# Altium footprint library PcbLib1.PcbLib: 136 footprints (part 4 of 9)
Each footprint in its own frame and in the unit in brackets; x right, y up, seen from the top. Pads: shape width x height; smd on the part's side, far side on the other; paste and mask are expansions set on the pad; w line width, h text height; cw(c..) or ccw(c..) is an arc to the next point about the centre after c.
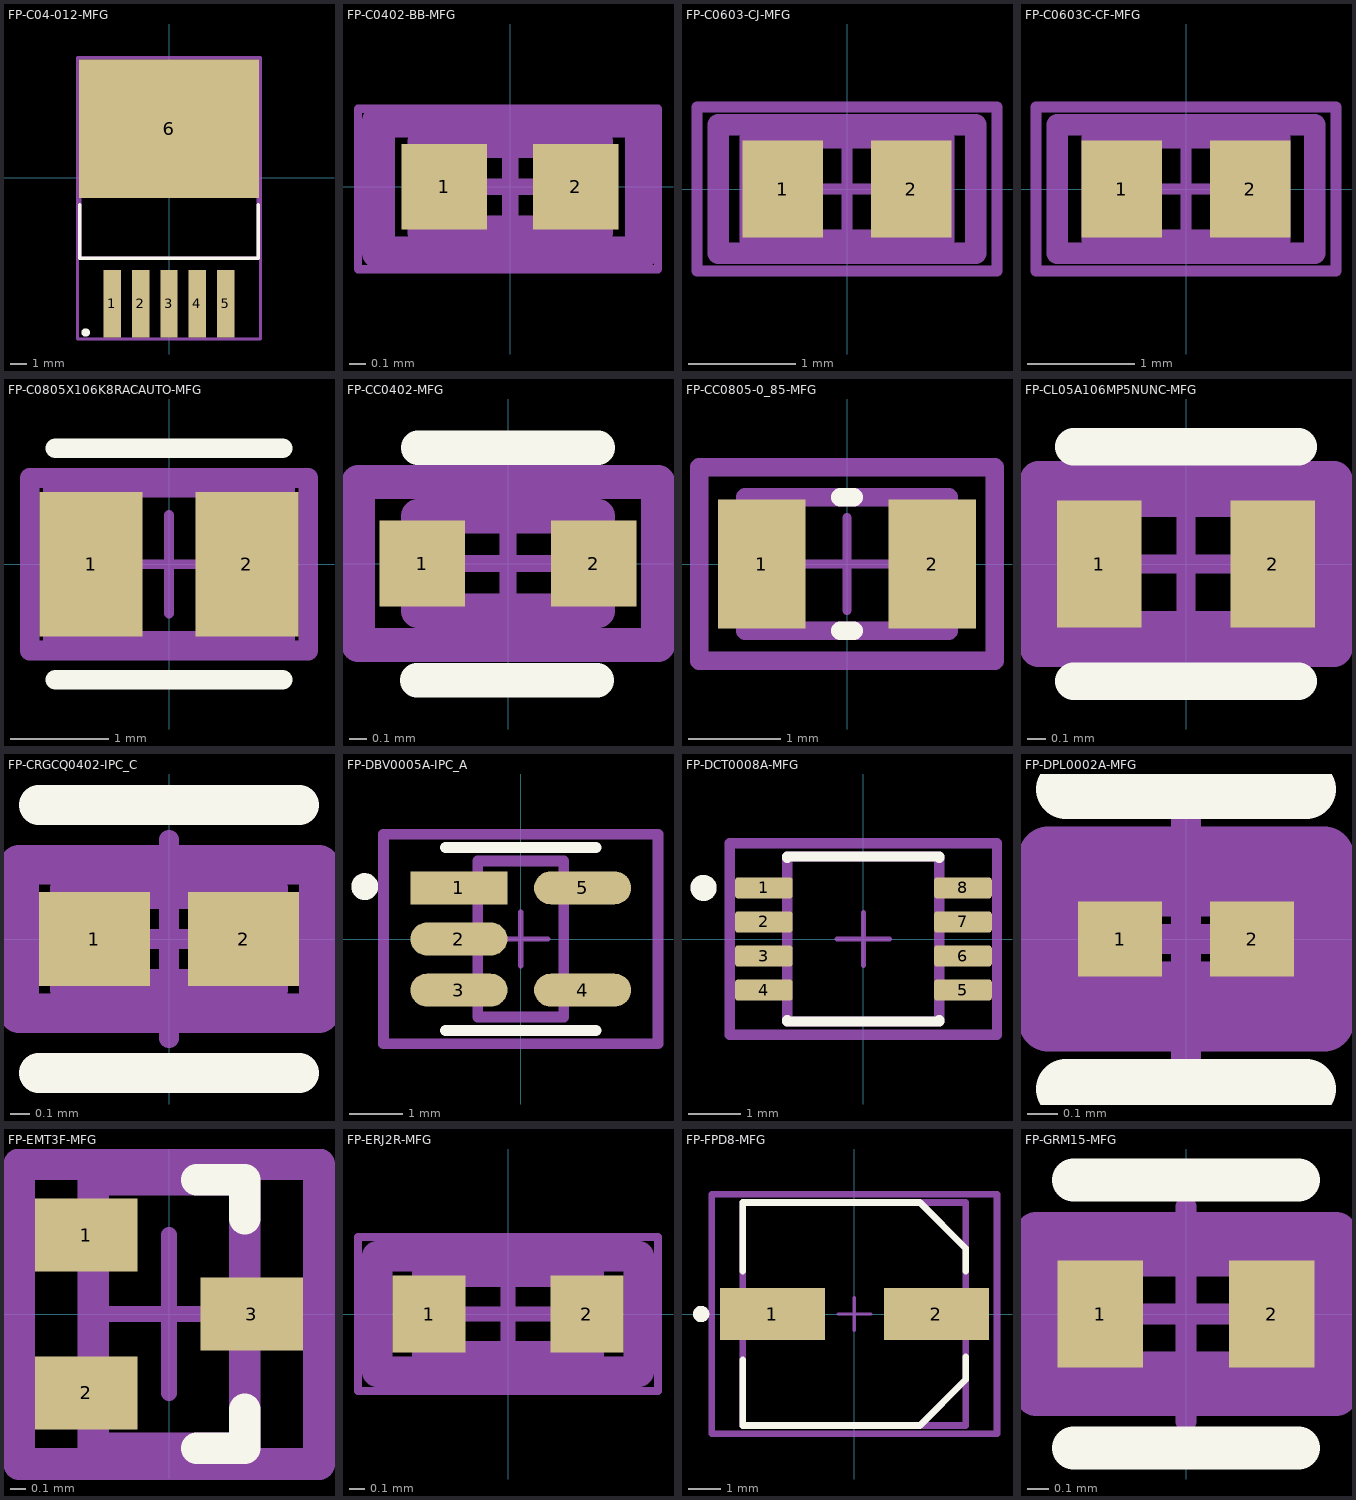
[diagram p3: the footprints below, top view; thin cyan lines are the x and y axes]

## FP-C04-012-MFG [mil]
pads (6):
  rect 41x159 smd paste+0 mask+0: 1(-134,-296.75) 2(-67,-296.75) 3(0,-296.75) 4(67,-296.75) 5(134,-296.75)
  rect 423x327 smd paste+0 mask+0: 6(0,114.75)
Top Overlay:
  circle w9.84: c-196.22,-364.89 r4.92
  lines w7.87: -210,-63.51 -210,-190 210,-190 210,-63.51
Top Courtyard:
  lines w7.87: -215.44,-380.19 -215.44,282.19 215.44,282.19 215.44,-380.19 -215.44,-380.19
Top 3D Body:
  lines w7.87: -210,-190 -210,190 210,190 210,-190 -210,-190
Top Assembly:
  lines w7.87: -215.44,-380.19 -215.44,282.19 215.44,282.19 215.44,-380.19 -215.44,-380.19
  text ".Designator" at 0,-49.02 h39.37
Top Component Center:
  lines w3.94: -19.68,0 19.68,0 ; 0,-19.68 0,19.68
3D body "IC_Microchip_MIC29302WU-TR_eec.STEP": height 200.04, standoff 0, extent -200,-344 200,244.5

## FP-C0402-BB-MFG [mm]
pads (2):
  rect 0.52x0.52 smd paste+0 mask+0: 1(-0.4,0) 2(0.4,0)
Top Courtyard:
  lines w0.2: -0.8,-0.4 -0.8,0.4 0.8,0.4 0.8,-0.4 -0.8,-0.4
Top 3D Body:
  lines w0.2: -0.525,-0.275 -0.525,0.275 0.525,0.275 0.525,-0.275 -0.525,-0.275
Top Assembly:
  lines w0.2: -0.8,-0.4 -0.8,0.4 0.8,0.4 0.8,-0.4 -0.8,-0.4
  text ".Designator" at -0.525,0.173 h0.25
Mechanical 15:
  lines w0.05: -0.925,-0.5 -0.925,0.475 -0.475,0.475 0.9,0.475 0.9,-0.5 -0.925,-0.5
Top Component Center:
  lines w0.1: -0.5,0 0.5,0 ; 0,-0.425 0,0.425
3D body "Cap_Kemet_C0402C562J5RACTU_eec.STEP": height 0.25, standoff 0, extent -0.8,-0.4 0.8,0.4

## FP-C0603-CJ-MFG [mm]
pads (2):
  rect 0.75x0.9 smd paste+0 mask+0: 1(-0.6,0) 2(0.6,0)
Top Courtyard:
  lines w0.2: -1.2,-0.6 -1.2,0.6 1.2,0.6 1.2,-0.6 -1.2,-0.6
Top 3D Body:
  lines w0.2: -0.9,-0.475 -0.9,0.475 0.9,0.475 0.9,-0.475 -0.9,-0.475
Top Assembly:
  lines w0.2: -1.2,-0.6 -1.2,0.6 1.2,0.6 1.2,-0.6 -1.2,-0.6
  text ".Designator" at 0,0.024 h0.13
Mechanical 15:
  lines w0.101: -1.397,-0.762 1.397,-0.762 1.397,0.762 -1.397,0.762 -1.397,-0.762
Top Component Center:
  lines w0.1: -0.5,0 0.5,0 ; 0,-0.5 0,0.5
3D body "Cap_KEMET_C0603C105K8RACAUTO_eec.STEP": height 0.95, standoff 0, extent -0.8,-0.4 0.8,0.4

## FP-C0603C-CF-MFG [mm]
pads (2):
  rect 0.75x0.9 smd paste+0 mask+0: 1(-0.6,0) 2(0.6,0)
Top Courtyard:
  lines w0.2: -1.2,-0.6 -1.2,0.6 1.2,0.6 1.2,-0.6 -1.2,-0.6
Top 3D Body:
  lines w0.2: -0.875,-0.475 -0.875,0.475 0.875,0.475 0.875,-0.475 -0.875,-0.475
Top Assembly:
  lines w0.2: -1.2,-0.6 -1.2,0.6 1.2,0.6 1.2,-0.6 -1.2,-0.6
  text ".Designator" at 0,0.024 h0.13
Mechanical 15:
  lines w0.101: -1.397,-0.762 1.397,-0.762 1.397,0.762 -1.397,0.762 -1.397,-0.762
Top Component Center:
  lines w0.1: -0.5,0 0.5,0 ; 0,-0.5 0,0.5
3D body "Cap_KEMET_C0603C272M5JACTU_eec.STEP": height 0.87, standoff 0, extent -0.8,-0.4 0.8,0.4

## FP-C0805X106K8RACAUTO-MFG [mm]
pads (2):
  rect 1.04x1.46 smd paste+0 mask+0: 1(-0.79,0) 2(0.79,0)
Top Overlay:
  lines w0.2: -1.15,-1.17 1.15,-1.17 ; -1.15,1.175 1.15,1.175
Top Courtyard:
  lines w0.2: -1.41,-0.875 -1.41,0.875 1.41,0.875 1.41,-0.875 -1.41,-0.875
Top 3D Body:
  lines w0.2: -1.175,-0.775 -1.175,0.775 1.175,0.775 1.175,-0.775 -1.175,-0.775
Top Assembly:
  lines w0.2: -1.41,-0.875 -1.41,0.875 1.41,0.875 1.41,-0.875 -1.41,-0.875
  text ".Designator" at 0,0.024 h0.13
Top Component Center:
  lines w0.1: -0.5,0 0.5,0 ; 0,-0.5 0,0.5
3D body "Cap_KEMET_C0805X106K8RACAUTO_eec.STEP": height 0.25, standoff 0, extent -1.41,-0.875 1.41,0.875

## FP-CC0402-MFG [mm]
pads (2):
  rect 0.5x0.5 smd paste+0 mask+0: 1(-0.5,0) 2(0.5,0)
Top Overlay:
  lines w0.2: -0.53,-0.681 0.52,-0.681 ; -0.525,0.675 0.525,0.675
Top Courtyard:
  lines w0.2: -0.875,-0.475 -0.875,0.475 0.875,0.475 0.875,-0.475 -0.875,-0.475
Top 3D Body:
  lines w0.2: -0.525,-0.275 -0.525,0.275 0.525,0.275 0.525,-0.275 -0.525,-0.275
Top Assembly:
  lines w0.2: -0.875,-0.475 -0.875,0.475 0.875,0.475 0.875,-0.475 -0.875,-0.475
  text ".Designator" at 0,0.024 h0.13
Top Component Center:
  lines w0.1: -0.5,0 0.5,0 ; 0,-0.5 0,0.5
3D body "Cap_YAGEO_CC0402KRX7R9BB101_eec.STEP": height 0.25, standoff 0, extent -0.875,-0.475 0.875,0.475

## FP-CC0805-0_85-MFG [mm]
pads (2):
  rect 0.95x1.4 smd paste+0 mask+0: 1(-0.925,0) 2(0.925,0)
Top Overlay:
  lines w0.2: -0.075,-0.725 0.075,-0.725 ; -0.075,0.725 0.075,0.725
Top Courtyard:
  lines w0.2: -1.6,-1.05 1.6,-1.05 1.6,1.05 -1.6,1.05 -1.6,-1.05
Top 3D Body:
  lines w0.2: -1.1,-0.725 1.1,-0.725 1.1,0.725 -1.1,0.725 -1.1,-0.725
Top Assembly:
  lines w0.2: -1.6,-1.05 1.6,-1.05 1.6,1.05 -1.6,1.05 -1.6,-1.05
  text ".Designator" at 0,0.024 h0.13
Top Component Center:
  lines w0.1: -0.5,0 0.5,0 ; 0,-0.5 0,0.5
3D body "Cap_Yageo_CC0805KKX7R7BB105_eec.STEP": height 0.95, standoff 0, extent -1,-0.625 1,0.625

## FP-CL05A106MP5NUNC-MFG [mm]
pads (2):
  rect 0.45x0.675 smd paste+0 mask+0: 1(-0.463,0) 2(0.463,0)
Top Overlay:
  lines w0.2: -0.6,-0.625 0.6,-0.625 ; -0.6,0.625 0.6,0.625
Top Courtyard:
  lines w0.2: -0.787,-0.45 -0.787,0.45 0.787,0.45 0.787,-0.45 -0.787,-0.45
Top 3D Body:
  lines w0.2: -0.6,-0.35 -0.6,0.35 0.6,0.35 0.6,-0.35 -0.6,-0.35
Top Assembly:
  lines w0.2: -0.787,-0.45 -0.787,0.45 0.787,0.45 0.787,-0.45 -0.787,-0.45
  text ".Designator" at 0,0.024 h0.13
Top Component Center:
  lines w0.1: -0.5,0 0.5,0 ; 0,-0.5 0,0.5
3D body "Cap_Samsung_CL05A106MP5NUNC_eec.STEP": height 0.25, standoff 0, extent -0.787,-0.45 0.787,0.45

## FP-CRGCQ0402-IPC_C [mm]
pads (2):
  rect 0.56x0.472 smd paste+0 mask+0: 1(-0.376,0) 2(0.376,0)
Top Overlay:
  lines w0.2: -0.656,-0.675 0.656,-0.675 ; -0.656,0.675 0.656,0.675
Top Courtyard:
  lines w0.2: -0.756,-0.375 -0.756,0.375 0.756,0.375 0.756,-0.375 -0.756,-0.375
Top 3D Body:
  lines w0.2: -0.5,-0.25 -0.5,0.25 0.5,0.25 0.5,-0.25 -0.5,-0.25
Top Assembly:
  lines w0.2: -0.756,-0.375 -0.756,0.375 0.756,0.375 0.756,-0.375 -0.756,-0.375
  text ".Designator" at 0,0.024 h0.13
Top Component Center:
  lines w0.1: -0.5,0 0.5,0 ; 0,-0.5 0,0.5
3D body "Res_TE_Connectivity_CRGCQ0402F10R_eec.STEP": height 0.4, standoff 0, extent -0.5,-0.25 0.5,0.25

## FP-DBV0005A-IPC_A [mm]
pads (5):
  rect 1.805x0.612 smd paste+0 mask+0: 1(-1.15,0.95)
  rrect100% 1.805x0.612 smd paste+0 mask+0: 2(-1.15,0) 3(-1.15,-0.95) 4(1.15,-0.95) 5(1.15,0.95)
Top Overlay:
  circle w0.25: c-2.903,0.975 r0.125
  lines w0.2: -1.4,-1.7 1.4,-1.7 ; -1.4,1.7 1.4,1.7
Top Courtyard:
  lines w0.2: -2.553,-1.95 -2.553,1.95 2.553,1.95 2.553,-1.95 -2.553,-1.95
Top 3D Body:
  lines w0.2: -0.8,-1.45 -0.8,1.45 0.8,1.45 0.8,-1.45 -0.8,-1.45
Top Assembly:
  lines w0.2: -2.553,-1.95 -2.553,1.95 2.553,1.95 2.553,-1.95 -2.553,-1.95
  text ".Designator" at 0,-0.14 h0.25
Top Component Center:
  lines w0.1: -0.5,0 0.5,0 ; 0,-0.5 0,0.5
3D body "IC_Texas_Instruments_SN74AHC1G00DBVR_eec.STEP": height 0.25, standoff 0, extent -2.553,-1.95 2.553,1.95

## FP-DCT0008A-MFG [mm]
pads (8):
  rrect25% 1.1x0.4 smd paste+0 mask+0: 1(-1.9,0.975) 2(-1.9,0.325) 3(-1.9,-0.325) 4(-1.9,-0.975) 5(1.9,-0.975) 6(1.9,-0.325) 7(1.9,0.325) 8(1.9,0.975)
Top Overlay:
  circle w0.25: c-3.052,0.975 r0.125
  lines w0.2: -1.45,-1.55 -1.45,-1.575 1.45,-1.575 1.45,-1.55 ; -1.45,1.55 -1.45,1.575 1.45,1.575 1.45,1.55
Top Courtyard:
  lines w0.2: -2.55,-1.825 -2.55,1.825 2.55,1.825 2.55,-1.825 -2.55,-1.825
Top 3D Body:
  lines w0.2: -1.45,-1.575 -1.45,1.575 1.45,1.575 1.45,-1.575 -1.45,-1.575
Top Assembly:
  lines w0.2: -2.55,-1.825 -2.55,1.825 2.55,1.825 2.55,-1.825 -2.55,-1.825
  text ".Designator" at 0,0.048 h0.25
Top Component Center:
  lines w0.1: -0.5,0 0.5,0 ; 0,-0.5 0,0.5
3D body "IC_Texas_Instruments_SN74LVC3G34DCTR_eec.STEP": height 0.25, standoff 0, extent -2.55,-1.825 2.55,1.825

## FP-DPL0002A-MFG [mm]
pads (2):
  rect 0.28x0.25 smd paste+0 mask+0: 1(-0.22,0) 2(0.22,0)
Top Overlay:
  lines w0.2: -0.4,-0.5 0.4,-0.5 ; -0.4,0.5 0.4,0.5
Top Courtyard:
  lines w0.2: -0.46,-0.275 0.46,-0.275 0.46,0.275 -0.46,0.275 -0.46,-0.275
Top 3D Body:
  lines w0.2: -0.325,-0.175 0.325,-0.175 0.325,0.175 -0.325,0.175 -0.325,-0.175
Top Assembly:
  lines w0.2: -0.46,-0.275 0.46,-0.275 0.46,0.275 -0.46,0.275 -0.46,-0.275
  text ".Designator" at 0,0.024 h0.13
Top Component Center:
  lines w0.1: -0.5,0 0.5,0 ; 0,-0.5 0,0.5
3D body "Diode_Texas_Instruments_TPD1E6B06DPLR_eec.STEP": height 0.32, standoff 0, extent -0.3,-0.15 0.3,0.15

## FP-EMT3F-MFG [mm]
pads (3):
  rect 0.65x0.46 smd paste+0 mask+0: 1(-0.525,0.5) 2(-0.525,-0.5) 3(0.525,0)
Top Overlay:
  lines w0.2: 0.175,-0.85 0.48,-0.85 0.48,-0.605 ; 0.175,0.85 0.48,0.85 0.48,0.605
Top Courtyard:
  lines w0.2: -0.95,-0.95 -0.95,0.95 0.95,0.95 0.95,-0.95 -0.95,-0.95
Top 3D Body:
  lines w0.2: -0.48,-0.85 -0.48,0.85 0.48,0.85 0.48,-0.85 -0.48,-0.85
Top Assembly:
  lines w0.2: -0.95,-0.95 -0.95,0.95 0.95,0.95 0.95,-0.95 -0.95,-0.95
  text ".Designator" at 0,-0.164 h0.13
Top Component Center:
  lines w0.1: -0.5,0 0.5,0 ; 0,-0.5 0,0.5
3D body "Trans_Rohm_RE1E002SPTCL_eec.STEP": height 0.85, standoff 0, extent -0.8,-0.8 0.8,0.8

## FP-ERJ2R-MFG [mm]
pads (2):
  rect 0.475x0.5 smd paste+0 mask+0: 1(-0.512,0) 2(0.513,0)
Top Courtyard:
  lines w0.2: -0.85,-0.375 -0.85,0.375 0.85,0.375 0.85,-0.375 -0.85,-0.375
Top 3D Body:
  lines w0.2: -0.525,-0.275 -0.525,0.275 0.525,0.275 0.525,-0.275 -0.525,-0.275
Top Assembly:
  lines w0.2: -0.85,-0.375 -0.85,0.375 0.85,0.375 0.85,-0.375 -0.85,-0.375
  text ".Designator" at -0.525,0.173 h0.25
Mechanical 15:
  lines w0.05: -0.975,-0.5 -0.975,0.5 0.975,0.5 0.975,-0.5 -0.975,-0.5
Top Component Center:
  lines w0.1: -0.5,0 0.5,0 ; 0,-0.4 0,0.375
3D body "Res_Panasonic_ERJ-2RKF1502X_eec.STEP": height 0.25, standoff 0, extent -0.85,-0.375 0.85,0.375

## FP-FPD8-MFG [mm]
pads (2):
  rect 3.2x1.6 smd paste+0 mask+0: 1(-2.5,0) 2(2.5,0)
Top Overlay:
  circle w0.25: c-4.675,0 r0.125
  lines w0.2: -3.4,-1.4 -3.4,-3.4 2,-3.4 3.4,-2 3.4,-1.3 ; -3.4,1.3 -3.4,3.4 2,3.4 3.4,2 3.4,1.3
Top Courtyard:
  lines w0.2: -4.35,-3.65 -4.35,3.65 4.35,3.65 4.35,-3.65 -4.35,-3.65
Top 3D Body:
  lines w0.2: -3.4,-3.4 -3.4,3.4 3.4,3.4 3.4,-3.4 -3.4,-3.4
Top Assembly:
  lines w0.2: -4.35,-3.65 -4.35,3.65 4.35,3.65 4.35,-3.65 -4.35,-3.65
  text ".Designator" at -1.651,1.204 h1
Top Component Center:
  lines w0.1: -0.5,0 0.5,0 ; 0,-0.5 0,0.5
3D body "Cap_Panasonic_EEEFPV680XAP_eec.STEP": height 0.25, standoff 0, extent -4.35,-3.65 4.35,3.65

## FP-GRM15-MFG [mm]
pads (2):
  rect 0.4x0.5 smd paste+0 mask+0: 1(-0.4,0) 2(0.4,0)
Top Overlay:
  lines w0.2: -0.525,-0.625 0.525,-0.625 ; -0.525,0.625 0.525,0.625
Top Courtyard:
  lines w0.2: -0.7,-0.375 0.7,-0.375 0.7,0.375 -0.7,0.375 -0.7,-0.375
Top 3D Body:
  lines w0.2: -0.525,-0.275 0.525,-0.275 0.525,0.275 -0.525,0.275 -0.525,-0.275
Top Assembly:
  lines w0.2: -0.7,-0.375 0.7,-0.375 0.7,0.375 -0.7,0.375 -0.7,-0.375
  text ".Designator" at -0.127,0.151 h0.13
Top Component Center:
  lines w0.1: -0.5,0 0.5,0 ; 0,-0.5 0,0.5
3D body "Cap_Murata_GRM155R71C104KA88D_eec.STEP": height 0.25, standoff 0, extent -0.7,-0.375 0.7,0.375